# Altium footprint library 6-Connectors-5.PcbLib: 46 footprints (part 3 of 5)
Each footprint in its own frame and in the unit in brackets; x right, y up, seen from the top. Pads: shape width x height; smd on the part's side, far side on the other; paste and mask are expansions set on the pad; w line width, h text height; cw(c..) or ccw(c..) is an arc to the next point about the centre after c.
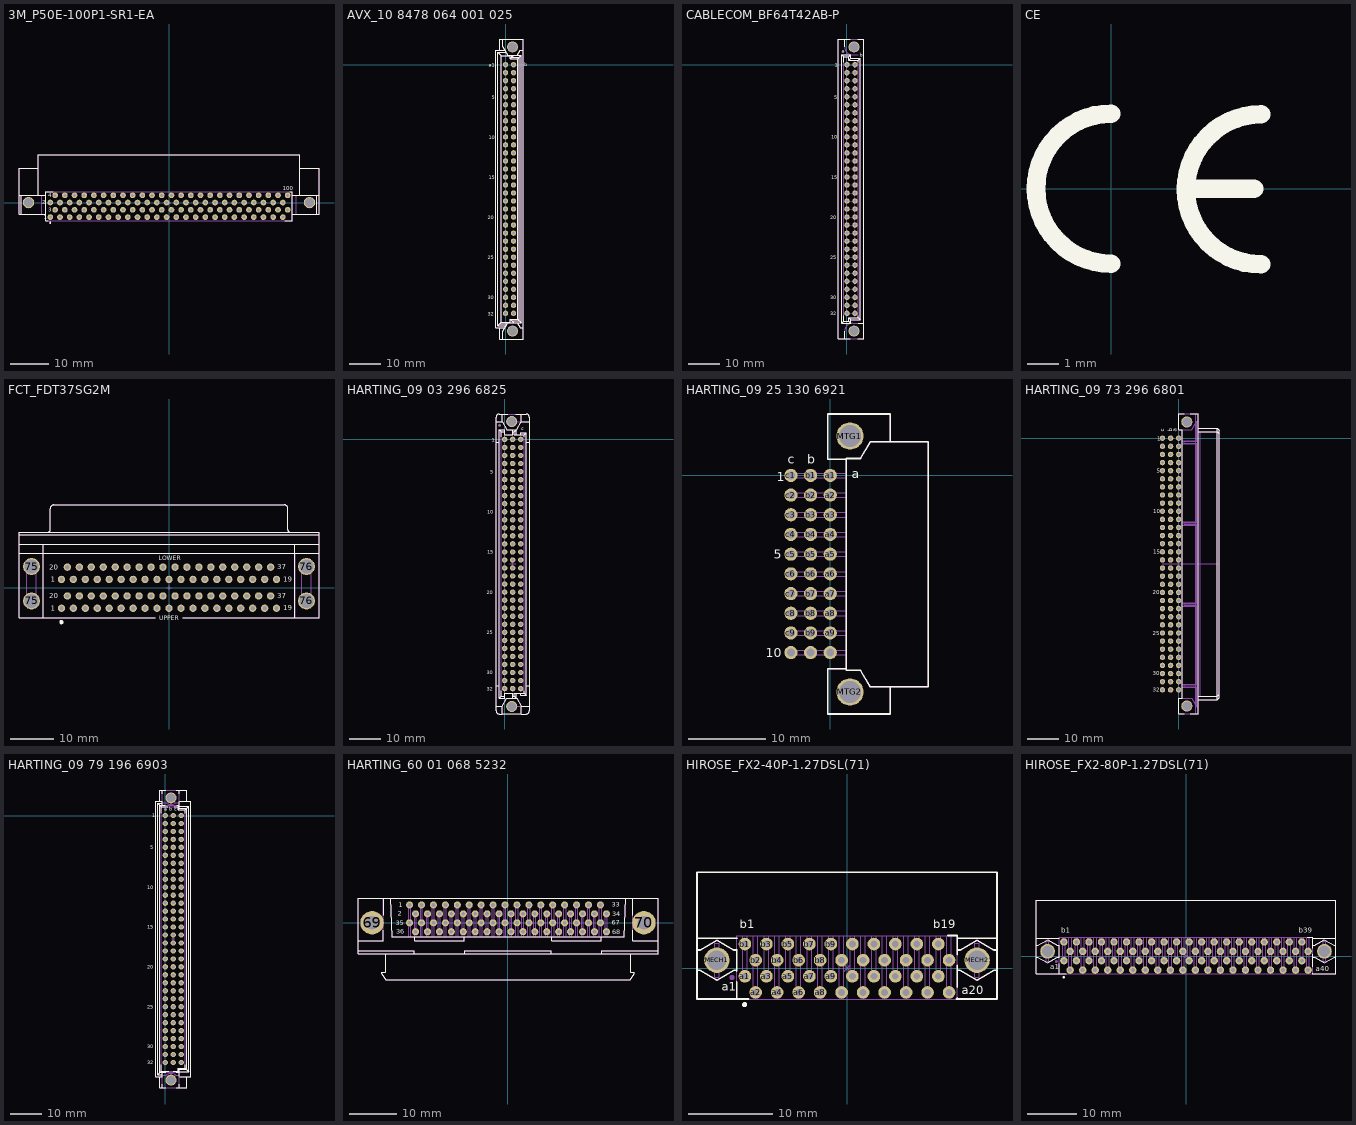
[diagram p2: the footprints below, top view; thin cyan lines are the x and y axes]

## 3M_P50E-100P1-SR1-EA [mm] "100 Contacts - .050\" Right Angle, Pak 50 Boardmount Plug, P50E Series"
height 7
pads (102):
  round 1.5 hole 0.8: 1(-31.115,-3.81) 2(-31.115,0) 3(-29.845,-1.905) 4(-29.845,1.905) 5(-28.575,-3.81) 6(-28.575,0) 7(-27.305,-1.905) 8(-27.305,1.905) 9(-26.035,-3.81) 10(-26.035,0) 11(-24.765,-1.905) 12(-24.765,1.905) 13(-23.495,-3.81) 14(-23.495,0) 15(-22.225,-1.905) 16(-22.225,1.905) 17(-20.955,-3.81) 18(-20.955,0) 19(-19.685,-1.905) 20(-19.685,1.905) 21(-18.415,-3.81) 22(-18.415,0) 23(-17.145,-1.905) 24(-17.145,1.905) 25(-15.875,-3.81) 26(-15.875,0) 27(-14.605,-1.905) 28(-14.605,1.905) 29(-13.335,-3.81) 30(-13.335,0) 31(-12.065,-1.905) 32(-12.065,1.905) 33(-10.795,-3.81) 34(-10.795,0) 35(-9.525,-1.905) 36(-9.525,1.905) 37(-8.255,-3.81) 38(-8.255,0) 39(-6.985,-1.905) 40(-6.985,1.905) 41(-5.715,-3.81) 42(-5.715,0) 43(-4.445,-1.905) 44(-4.445,1.905) 45(-3.175,-3.81) 46(-3.175,0) 47(-1.905,-1.905) 48(-1.905,1.905) 49(-0.635,-3.81) 50(-0.635,0) 51(0.635,-1.905) 52(0.635,1.905) 53(1.905,-3.81) 54(1.905,0) 55(3.175,-1.905) 56(3.175,1.905) 57(4.445,-3.81) 58(4.445,0) 59(5.715,-1.905) 60(5.715,1.905) 61(6.985,-3.81) 62(6.985,0) 63(8.255,-1.905) 64(8.255,1.905) 65(9.525,-3.81) 66(9.525,0) 67(10.795,-1.905) 68(10.795,1.905) 69(12.065,-3.81) 70(12.065,0) 71(13.335,-1.905) 72(13.335,1.905) 73(14.605,-3.81) 74(14.605,0) 75(15.875,-1.905) 76(15.875,1.905) 77(17.145,-3.81) 78(17.145,0) 79(18.415,-1.905) 80(18.415,1.905) 81(19.685,-3.81) 82(19.685,0) 83(20.955,-1.905) 84(20.955,1.905) 85(22.225,-3.81) 86(22.225,0) 87(23.495,-1.905) 88(23.495,1.905) 89(24.765,-3.81) 90(24.765,0) 91(26.035,-1.905) 92(26.035,1.905) 93(27.305,-3.81) 94(27.305,0) 95(28.575,-1.905) 96(28.575,1.905) 97(29.845,-3.81) 98(29.845,0) 99(31.115,-1.905) 100(31.115,1.905)
  round 3 hole 2.3: 101(-36.83,0) 102(36.83,0)
Top Overlay:
  circle w0.3: c-31.115,-5.334 r0.15
  lines w0.2: -39.319,1.906 -32.258,1.906 ; -38.71,-3.098 -38.71,1.906 ; -34.29,1.906 -34.29,12.6 34.29,12.6 34.29,1.906 ; -34.29,8.942 -39.319,8.942 -39.319,-3.098 -32.258,-3.098 ; -31.596,-4.799 -32.258,-4.799 -32.258,2.897 -30.321,2.897 ; 30.326,-4.799 32.258,-4.799 32.258,2.897 31.591,2.897 ; 32.258,-3.098 39.319,-3.098 39.319,8.942 34.29,8.942 ; 32.258,1.906 39.319,1.906 ; 38.71,-3.098 38.71,1.906
  text "3" at -31.669,-2.389 h1.02
  text "4" at -31.669,1.421 h1.02
  text "100" at 29.799,3.199 h1.02
  text "2" at -33.242,-0.484 h1.02
  text "1" at -32.863,-4.421 h1.02
Mechanical 8:
  drawing of 417 lines, arcs and shapes, not listed
Mechanical 14:
  circle w0.1: c-36.83,0 r1.156
  circle w0.1: c36.83,0 r1.156
  circle w0.3: c-31.115,-5.334 r0.15
  lines w0.1: -39.319,1.906 -32.258,1.906 ; -38.71,-3.098 -38.71,1.906 ; -34.29,1.906 -34.29,12.6 34.29,12.6 34.29,1.906 ; -34.29,8.942 -39.319,8.942 -39.319,-3.098 -32.258,-3.098 ; -33.299,-3.098 -33.299,1.906 ; 32.258,-3.098 39.319,-3.098 39.319,8.942 34.29,8.942 ; 32.258,1.906 39.319,1.906 ; 33.299,-3.098 33.299,1.906 ; 38.71,-3.098 38.71,1.906 ; -32.258,-4.799 -32.258,2.897 32.258,2.897 32.258,-4.799 -32.258,-4.799
  text "3" at -31.669,-2.389 h1.02
  text "4" at -31.669,1.421 h1.02
  text "100" at 29.799,3.199 h1.02
  text "2" at -33.242,-0.484 h1.02
  text "1" at -32.863,-4.421 h1.02
3D body "3M_P50E-100P1-SR1.stp": height 7.01, standoff -3, extent -39.319,-4.799 39.319,12.6

## AVX_10 8478 064 001 025 [mm] "DIN 41612, Type Q, Thru-Hole Press-Fit Terminations; Rows a+b, 64 Position, Performance level 2, Lead 5.3mm, Straight Male Connector"
height 11.48
pads (66):
  round 1.7 hole 1: a1(0,0) a2(0,-2.54) a3(0,-5.08) a4(0,-7.62) a5(0,-10.16) a6(0,-12.7) a7(0,-15.24) a8(0,-17.78) a9(0,-20.32) a10(0,-22.86) a11(0,-25.4) a12(0,-27.94) a13(0,-30.48) a14(0,-33.02) a15(0,-35.56) a16(0,-38.1) a17(0,-40.64) a18(0,-43.18) a19(0,-45.72) a20(0,-48.26) a21(0,-50.8) a22(0,-53.34) a23(0,-55.88) a24(0,-58.42) a25(0,-60.96) a26(0,-63.5) a27(0,-66.04) a28(0,-68.58) a29(0,-71.12) a30(0,-73.66) a31(0,-76.2) a32(0,-78.74) b1(2.54,0) b2(2.54,-2.54) b3(2.54,-5.08) b4(2.54,-7.62) b5(2.54,-10.16) b6(2.54,-12.7) b7(2.54,-15.24) b8(2.54,-17.78) b9(2.54,-20.32) b10(2.54,-22.86) b11(2.54,-25.4) b12(2.54,-27.94) b13(2.54,-30.48) b14(2.54,-33.02) b15(2.54,-35.56) b16(2.54,-38.1) b17(2.54,-40.64) b18(2.54,-43.18) b19(2.54,-45.72) b20(2.54,-48.26) b21(2.54,-50.8) b22(2.54,-53.34) b23(2.54,-55.88) b24(2.54,-58.42) b25(2.54,-60.96) b26(2.54,-63.5) b27(2.54,-66.04) b28(2.54,-68.58) b29(2.54,-71.12) b30(2.54,-73.66) b31(2.54,-76.2) b32(2.54,-78.74)
  round 3.5 / inner round 3.5 / far side round 5.1 hole 2.8: MTG1(2.24,5.63) MTG2(2.24,-84.37)
Top Overlay:
  lines w0.2: -1.83,-83.32 -1.83,-86.87 5.57,-86.87 5.57,8.13 -1.83,8.13 -1.83,4.58 ; -1.83,-81.97 0.576,-81.97 ; -0.81,-86.87 -0.81,-84.37 0.749,-81.67 5.02,-81.67 ; -0.81,8.13 -0.81,5.63 0.749,2.93 5.02,2.93 ; -0.204,-83.32 -3.03,-83.32 -3.03,4.58 -0.204,4.58 ; 0.2,-82.62 -2.48,-82.62 ; 0.2,3.88 -2.48,3.88 ; 1.97,-81.02 4.37,-81.02 4.37,2.28 1.97,2.28 1.97,2.93 ; 2.62,-81.67 1.52,-80.57 ; 2.62,2.93 1.52,1.83 ; 3.731,-81.67 4.684,-83.32 5.57,-83.323 ; 3.731,2.93 4.684,4.58 5.57,4.58 ; -2.48,-82.62 -1.38,-81.52 ; -2.48,-82.62 -2.48,3.88 ; -2.48,3.88 -1.38,2.78 ; -1.38,-81.52 1.52,-81.52 1.52,-80.57 ; -1.38,-81.52 -1.38,2.78 ; -1.38,2.78 1.52,2.78 1.52,1.83 ; 1.52,-80.57 3.92,-80.57 ; 1.52,1.83 3.92,1.83 ; 3.92,-80.57 5.02,-81.67 ; 3.92,-80.57 3.92,1.83 ; 3.92,1.83 5.02,2.93 ; 5.02,-81.67 5.02,2.93
  text "b" at 5.945,-0.574 h1.2
  text "32" at -5.575,-79.44 h1.2
  text "5" at -4.35,-10.91 h1.2
  text "10" at -5.275,-23.56 h1.2
  text "30" at -5.575,-74.36 h1.2
  text "25" at -5.575,-61.66 h1.2
  text "20" at -5.575,-48.96 h1.2
  text "15" at -5.275,-36.26 h1.2
  text "a1" at -5.325,-0.625 h1.2
Mechanical 8:
  drawing of 268 lines, arcs and shapes, not listed
Mechanical 14:
  circle w0.1: c2.24,-84.37 r1.27
  circle w0.1: c2.24,5.63 r1.27
  lines w0.1: -1.83,-83.32 -1.83,-86.87 5.57,-86.87 5.57,8.13 -1.83,8.13 -1.83,4.58 ; -1.83,-81.97 0.576,-81.97 ; -0.81,-86.87 -0.81,-84.37 0.749,-81.67 5.02,-81.67 ; -0.81,8.13 -0.81,5.63 0.749,2.93 5.02,2.93 ; -0.204,-83.32 -3.03,-83.32 -3.03,4.58 -0.204,4.58 ; 0.2,-82.62 -2.48,-82.62 ; 0.2,3.88 -2.48,3.88 ; 1.97,-81.02 4.37,-81.02 4.37,2.28 1.97,2.28 1.97,2.93 ; 2.62,-81.67 1.52,-80.57 ; 2.62,2.93 1.52,1.83 ; 3.731,-81.67 4.684,-83.32 5.57,-83.323 ; 3.731,2.93 4.684,4.58 5.57,4.58 ; -2.48,-82.62 -1.38,-81.52 ; -2.48,-82.62 -2.48,3.88 ; -2.48,3.88 -1.38,2.78 ; -1.38,-81.52 1.52,-81.52 1.52,-80.57 ; -1.38,-81.52 -1.38,2.78 ; -1.38,2.78 1.52,2.78 1.52,1.83 ; 1.52,-80.57 3.92,-80.57 ; 1.52,1.83 3.92,1.83 ; 3.92,-80.57 5.02,-81.67 ; 3.92,-80.57 3.92,1.83 ; 3.92,1.83 5.02,2.93 ; 5.02,-81.67 5.02,2.93
  text "a1" at -5.325,-0.625 h1.2
  text "b" at 5.945,-0.574 h1.2
  text "32" at -5.575,-79.44 h1.2
  text "5" at -4.35,-10.91 h1.2
  text "10" at -5.275,-23.56 h1.2
  text "15" at -5.275,-36.26 h1.2
  text "20" at -5.575,-48.96 h1.2
  text "25" at -5.575,-61.66 h1.2
  text "30" at -5.575,-74.36 h1.2
Drill Drawing:
  lines w0.1: 4.27,-57.71 4.27,-80.17 -1.71,-80.17 -1.71,1.43 4.37,1.43 4.37,-19.61
  text "PRESS-FIT TECHNOLOGY diam. 1mm +0.09 -0.06" at 5.34,-56.3 h1
3D body "AVX_10 8478 064 001 025.stp": height 11.6, standoff -5.3, extent -3.03,-86.87 5.57,8.13

## CABLECOM_BF64T42AB-P [mm] "DIN 41612, Type B, Thru-Hole; Rows a+b, 64 Position, Straight Female Connector"
height 11.6
pads (66):
  round 1.7 hole 1: a1(0,0) a2(0,-2.54) a3(0,-5.08) a4(0,-7.62) a5(0,-10.16) a6(0,-12.7) a7(0,-15.24) a8(0,-17.78) a9(0,-20.32) a10(0,-22.86) a11(0,-25.4) a12(0,-27.94) a13(0,-30.48) a14(0,-33.02) a15(0,-35.56) a16(0,-38.1) a17(0,-40.64) a18(0,-43.18) a19(0,-45.72) a20(0,-48.26) a21(0,-50.8) a22(0,-53.34) a23(0,-55.88) a24(0,-58.42) a25(0,-60.96) a26(0,-63.5) a27(0,-66.04) a28(0,-68.58) a29(0,-71.12) a30(0,-73.66) a31(0,-76.2) a32(0,-78.74) b1(2.54,0) b2(2.54,-2.54) b3(2.54,-5.08) b4(2.54,-7.62) b5(2.54,-10.16) b6(2.54,-12.7) b7(2.54,-15.24) b8(2.54,-17.78) b9(2.54,-20.32) b10(2.54,-22.86) b11(2.54,-25.4) b12(2.54,-27.94) b13(2.54,-30.48) b14(2.54,-33.02) b15(2.54,-35.56) b16(2.54,-38.1) b17(2.54,-40.64) b18(2.54,-43.18) b19(2.54,-45.72) b20(2.54,-48.26) b21(2.54,-50.8) b22(2.54,-53.34) b23(2.54,-55.88) b24(2.54,-58.42) b25(2.54,-60.96) b26(2.54,-63.5) b27(2.54,-66.04) b28(2.54,-68.58) b29(2.54,-71.12) b30(2.54,-73.66) b31(2.54,-76.2) b32(2.54,-78.74)
  round 3.5 / inner round 3.5 / far side round 5.1 hole 2.8: MTG1(2.24,5.63) MTG2(2.24,-84.37)
Top Overlay:
  lines w0.2: -1.08,-79.525 -1.08,-81.22 ; -1.08,0.785 -1.08,2.48 ; -0.71,-86.82 -0.71,-84.37 ; -0.71,5.63 -0.71,8.08 ; 1.105,-86.82 -2.73,-86.82 -2.73,8.08 1.105,8.08 ; 3.375,-86.82 5.27,-86.82 5.27,8.08 3.375,8.08 ; 3.532,-81.87 5.27,-81.87 ; 3.62,-79.525 3.62,-80.17 ; 3.62,0.785 3.62,1.43 ; -1.73,-81.87 -1.08,-81.22 ; -1.73,-81.87 -1.73,3.13 ; -1.73,-81.87 1.17,-81.87 ; -1.73,3.13 1.17,3.13 ; -1.73,3.13 -1.08,2.48 ; -1.08,-81.22 0.52,-81.22 ; -1.08,2.48 0.52,2.48 ; 0.52,-81.22 0.52,-80.17 ; 0.52,-81.22 1.17,-81.87 ; 0.52,-80.17 1.17,-80.82 ; 0.52,-80.17 3.62,-80.17 ; 0.52,1.43 1.17,2.08 ; 0.52,1.43 0.52,2.48 ; 0.52,1.43 3.62,1.43 ; 0.52,2.48 1.17,3.13 ; 1.17,-81.87 1.17,-80.82 ; 1.17,-80.82 4.27,-80.82 ; 1.17,2.08 4.27,2.08 ; 1.17,2.08 1.17,3.13 ; 3.62,-80.17 4.27,-80.82 ; 3.62,1.43 4.27,2.08 ; 4.27,-80.82 4.27,2.08
  text "b" at 4.064,2.556 h1.2
  text "a" at -1.651,3.81 h1.2
  text "32" at -5.25,-79.415 h1.2
  text "5" at -4.025,-10.885 h1.2
  text "10" at -4.95,-23.535 h1.2
  text "30" at -5.25,-74.335 h1.2
  text "25" at -5.25,-61.635 h1.2
  text "20" at -5.25,-48.935 h1.2
  text "15" at -4.95,-36.235 h1.2
  text "1" at -3.825,-0.725 h1.2
Mechanical 8:
  drawing of 264 lines, arcs and shapes, not listed
Mechanical 14:
  circle w0.1: c2.24,-84.37 r1.4
  circle w0.1: c2.24,5.63 r1.4
  lines w0.1: -0.71,-86.82 -0.71,-84.37 cw(c1.79,-84.37) 1.794,-81.87 ; -0.71,8.08 -0.71,5.63 ccw(c1.79,5.63) 1.794,3.13 ; 1.207,-81.87 -1.73,-81.87 ; 1.79,-81.87 5.27,-81.87 ; 1.79,3.13 3.625,3.13 ; -1.73,-81.87 -1.08,-81.22 ; -1.73,-81.87 -1.73,3.13 ; -1.73,3.13 1.17,3.13 ; -1.73,3.13 -1.08,2.48 ; -1.08,-81.22 -1.08,2.48 ; -1.08,-81.22 0.52,-81.22 ; -1.08,2.48 0.52,2.48 ; 0.52,-81.22 1.17,-81.87 1.17,-80.82 ; 0.52,-81.22 0.52,-80.17 ; 0.52,-80.17 1.17,-80.82 ; 0.52,-80.17 3.62,-80.17 ; 0.52,1.43 1.17,2.08 ; 0.52,1.43 0.52,2.48 ; 0.52,1.43 3.62,1.43 ; 0.52,2.48 1.17,3.13 ; 1.17,-80.82 4.27,-80.82 ; 1.17,2.08 4.27,2.08 ; 1.17,2.08 1.17,3.13 ; 3.62,-80.17 4.27,-80.82 ; 3.62,-80.17 3.62,1.43 ; 3.62,1.43 4.27,2.08 ; 4.27,-80.82 4.27,2.08 ; -2.73,-86.82 -2.73,8.08 5.27,8.08 5.27,-86.82 -2.73,-86.82
  text "1" at -3.825,-0.725 h1.2
  text "b" at 4.064,2.556 h1.2
  text "a" at -1.651,3.81 h1.2
  text "32" at -5.25,-79.415 h1.2
  text "5" at -4.025,-10.885 h1.2
  text "10" at -4.95,-23.535 h1.2
  text "15" at -4.95,-36.235 h1.2
  text "20" at -5.25,-48.935 h1.2
  text "25" at -5.25,-61.635 h1.2
  text "30" at -5.25,-74.335 h1.2
Drill Drawing:
  lines w0.1: -1.8,-58.42 -1.8,-81.28 4.4,-81.28 4.4,2.54 -1.8,2.54 -1.8,-20.32
  text "PRESS-FIT TECHNOLOGY diam. 1mm +/-0.05" at -1.925,-55.05 h1
3D body "CABLECOM_BF64T42AB-P.stp": height 11.6, standoff -4.5, extent -2.73,-86.82 5.27,8.08

## CE [mm]
Top Overlay:
  lines w0.6: 0,-2.413 cw(c0,0) 0,2.413 ; 2.53,0 4.6,0 ; 4.826,-2.438 cw(c4.826,-0.025) 4.826,2.388
3D body "ce.stp": height 0.02, standoff 0, extent -2.725,-2.725 4.82,2.725

## FCT_FDT37SG2M [mm] "Dual Stacked  Right Angled D-SUB 37 Pins Female Connector, With Threaded Insert UNC 4-40, And PCB Mount Retention"
height 31.5
pads (78):
  round 3.9 hole 3.2: 75(-31.75,-3.06) 75(-31.75,4.89) 76(31.75,-3.06) 76(31.75,4.89)
  round 1.7 hole 1: L1(-24.84,1.91) L2(-22.1,1.91) L3(-19.33,1.91) L4(-16.56,1.91) L5(-13.82,1.91) L6(-11.05,1.91) L7(-8.28,1.91) L8(-5.54,1.91) L9(-2.773,1.91) L10(0,1.91) L11(2.77,1.91) L12(5.54,1.91) L13(8.28,1.91) L14(11.05,1.91) L15(13.82,1.91) L16(16.56,1.91) L17(19.33,1.91) L18(22.1,1.91) L19(24.84,1.91) L20(-23.47,4.75) L21(-20.7,4.75) L22(-17.96,4.75) L23(-15.19,4.75) L24(-12.42,4.75) L25(-9.68,4.75) L26(-6.91,4.75) L27(-4.14,4.75) L28(-1.4,4.75) L29(1.4,4.75) L30(4.14,4.75) L31(6.91,4.75) L32(9.68,4.75) L33(12.42,4.75) L34(15.19,4.75) L35(17.96,4.75) L36(20.7,4.75) L37(23.47,4.75) U1(-24.84,-4.75) U2(-22.1,-4.75) U3(-19.33,-4.75) U4(-16.56,-4.75) U5(-13.82,-4.75) U6(-11.05,-4.75) U7(-8.28,-4.75) U8(-5.54,-4.75) U9(-2.773,-4.75) U10(0,-4.75) U11(2.77,-4.75) U12(5.54,-4.75) U13(8.28,-4.75) U14(11.05,-4.75) U15(13.82,-4.75) U16(16.56,-4.75) U17(19.33,-4.75) U18(22.1,-4.75) U19(24.84,-4.75) U20(-23.47,-1.91) U21(-20.7,-1.91) U22(-17.96,-1.91) U23(-15.19,-1.91) U24(-12.42,-1.91) U25(-9.68,-1.91) U26(-6.91,-1.91) U27(-4.14,-1.91) U28(-1.4,-1.91) U29(1.4,-1.91) U30(4.14,-1.91) U31(6.91,-1.91) U32(9.68,-1.91) U33(12.42,-1.91) U34(15.19,-1.91) U35(17.96,-1.91) U36(20.7,-1.91) U37(23.47,-1.91)
Top Overlay:
  circle w0.5: c-24.845,-7.955 r0.25
  lines w0.2: -34.65,9.99 34.65,9.99 ; -34.65,12.24 34.65,12.24 ; -34.55,7.99 34.55,7.99 ; -29.05,-6.96 -29.05,9.99 ; -27.949,12.84 ccw(c-27.949,13.34) -27.449,13.34 -27.449,18.265 cw(c-26.574,18.265) -26.574,19.14 26.572,19.14 cw(c26.572,18.265) 27.447,18.265 27.447,13.34 ccw(c27.947,13.34) 27.947,12.84 ; -3.14,-6.96 -34.65,-6.96 -34.65,12.84 34.65,12.84 34.65,-6.96 3.14,-6.96 ; 29.05,-6.96 29.05,9.99
  text "LOWER" at -2.425,6.335 h1
  text "UPPER" at -2.21,-7.485 h1
  text "19" at 26.386,1.398 h1.2
  text "19" at 26.386,-5.262 h1.2
  text "20" at -27.626,-2.472 h1.2
  text "20" at -27.626,4.188 h1.2
  text "37" at 25.016,-2.422 h1.2
  text "37" at 25.016,4.238 h1.2
  text "1" at -27.349,1.373 h1.2
  text "1" at -27.349,-5.287 h1.2
Mechanical 8:
  drawing of 316 lines, arcs and shapes, not listed
Mechanical 14:
  lines w0.1: -34.65,9.99 34.65,9.99 ; -34.65,12.24 34.65,12.24 ; -34.55,7.99 34.55,7.99 ; -29.05,-6.96 -29.05,7.99 -29.05,9.99 ; -27.949,12.84 ccw(c-27.949,13.34) -27.449,13.34 -27.449,18.265 cw(c-26.574,18.265) -26.574,19.14 26.572,19.14 cw(c26.572,18.265) 27.447,18.265 27.447,13.34 ccw(c27.947,13.34) 27.947,12.84 ; 3.14,-6.96 34.65,-6.96 34.65,12.84 -34.65,12.84 -34.65,-6.96 ; 29.05,-6.96 29.05,7.99 29.05,9.99 ; 30.684,5.09 30.684,-3.26 32.816,-3.26 32.816,5.09 ; 30.72,5.09 32.828,5.09 ; -34.65,-6.96 -3.14,-6.96 -34.65,-6.96 ; -32.816,-3.26 -32.816,5.09 -30.684,5.09 -30.684,-3.26 -32.816,-3.26
  text "LOWER" at -2.425,6.335 h1
  text "UPPER" at -2.21,-7.485 h1
  text "19" at 26.386,1.398 h1.2
  text "19" at 26.386,-5.262 h1.2
  text "20" at -27.626,-2.472 h1.2
  text "20" at -27.626,4.188 h1.2
  text "37" at 25.016,-2.422 h1.2
  text "37" at 25.016,4.238 h1.2
  text "1" at -27.349,1.373 h1.2
  text "1" at -27.349,-5.287 h1.2
3D body "FCT_FDT37SG2M.stp": height 31.7, standoff -3.5, extent -34.65,-6.96 34.65,19.14

## HARTING_09 03 296 6825 [mm] "DIN 41612, Type C,  Thru-Hole; Rows a+b+c, 96 Position, Performance level 2, Lead 4.5mm, Pitch 2.54mm, Straight Female Connector"
height 11.6
pads (98):
  round 1.7 hole 1: a1(0,0) a2(0,-2.54) a3(0,-5.08) a4(0,-7.62) a5(0,-10.16) a6(0,-12.7) a7(0,-15.24) a8(0,-17.78) a9(0,-20.32) a10(0,-22.86) a11(0,-25.4) a12(0,-27.94) a13(0,-30.48) a14(0,-33.02) a15(0,-35.56) a16(0,-38.1) a17(0,-40.64) a18(0,-43.18) a19(0,-45.72) a20(0,-48.26) a21(0,-50.8) a22(0,-53.34) a23(0,-55.88) a24(0,-58.42) a25(0,-60.96) a26(0,-63.5) a27(0,-66.04) a28(0,-68.58) a29(0,-71.12) a30(0,-73.66) a31(0,-76.2) a32(0,-78.74) b1(2.54,0) b2(2.54,-2.54) b3(2.54,-5.08) b4(2.54,-7.62) b5(2.54,-10.16) b6(2.54,-12.7) b7(2.54,-15.24) b8(2.54,-17.78) b9(2.54,-20.32) b10(2.54,-22.86) b11(2.54,-25.4) b12(2.54,-27.94) b13(2.54,-30.48) b14(2.54,-33.02) b15(2.54,-35.56) b16(2.54,-38.1) b17(2.54,-40.64) b18(2.54,-43.18) b19(2.54,-45.72) b20(2.54,-48.26) b21(2.54,-50.8) b22(2.54,-53.34) b23(2.54,-55.88) b24(2.54,-58.42) b25(2.54,-60.96) b26(2.54,-63.5) b27(2.54,-66.04) b28(2.54,-68.58) b29(2.54,-71.12) b30(2.54,-73.66) b31(2.54,-76.2) b32(2.54,-78.74) c1(5.08,0) c2(5.08,-2.54) c3(5.08,-5.08) c4(5.08,-7.62) c5(5.08,-10.16) c6(5.08,-12.7) c7(5.08,-15.24) c8(5.08,-17.78) c9(5.08,-20.32) c10(5.08,-22.86) c11(5.08,-25.4) c12(5.08,-27.94) c13(5.08,-30.48) c14(5.08,-33.02) c15(5.08,-35.56) c16(5.08,-38.1) c17(5.08,-40.64) c18(5.08,-43.18) c19(5.08,-45.72) c20(5.08,-48.26) c21(5.08,-50.8) c22(5.08,-53.34) c23(5.08,-55.88) c24(5.08,-58.42) c25(5.08,-60.96) c26(5.08,-63.5) c27(5.08,-66.04) c28(5.08,-68.58) c29(5.08,-71.12) c30(5.08,-73.66) c31(5.08,-76.2) c32(5.08,-78.74)
  round 3.5 / inner round 3.5 / far side round 5.1 hole 2.8: MTG1(2.24,5.63) MTG2(2.24,-84.37)
Top Overlay:
  lines w0.2: -2.71,-84.37 -0.735,-84.37 ; -2.71,-77.87 -1.685,-77.87 ; -1.685,-0.87 -2.71,-0.87 -2.71,5.63 -0.735,5.63 ; -1.035,-79.4 -1.035,-81.195 ; -1.035,0.775 -1.035,2.455 ; 1,8.03 -0.735,8.03 ; 2.54,-81.845 2.54,-81.195 ; 2.54,3.105 2.54,2.455 ; 3.5,8.03 5.215,8.03 ; 3.665,-80.145 3.665,-81.845 3.015,-81.195 ; 3.665,1.405 3.665,3.105 3.015,2.455 ; 6.115,-79.425 6.115,-80.145 ; 6.115,0.825 6.115,1.405 ; 6.765,-77.87 7.79,-77.87 ; 6.765,-0.87 7.79,-0.87 ; 7.79,-84.37 5.215,-84.37 ; 7.79,5.63 5.215,5.63 ; -1.685,-81.845 0,-81.845 0,-81.195 ; -1.685,-81.845 -1.035,-81.195 ; -1.685,-81.845 -1.685,3.105 ; -1.685,3.105 -1.035,2.455 ; -1.685,3.105 0,3.105 0,2.455 ; -1.035,-81.195 0,-81.195 ; -1.035,2.455 0,2.455 ; -0.735,-86.77 -1.71,-86.77 cw(c-1.71,-85.77) -2.71,-85.77 -2.71,7.03 cw(c-1.71,7.03) -1.71,8.03 -0.735,8.03 ; -0.735,-86.77 5.215,-86.77 ; -0.735,-86.77 -0.735,-84.37 ; -0.735,-84.37 0.723,-81.845 3.757,-81.845 5.215,-84.37 ; -0.735,5.63 0.723,3.105 3.757,3.105 5.215,5.63 ; -0.735,5.63 -0.735,8.03 ; 0,-81.195 0,-80.145 2.54,-80.145 2.54,-81.195 ; 0,2.455 0,1.405 2.54,1.405 2.54,2.455 ; 2.54,-81.195 3.015,-81.195 ; 2.54,2.455 3.015,2.455 ; 3.015,-81.195 3.015,-80.145 5.08,-80.145 ; 3.015,2.455 3.015,1.405 5.08,1.405 ; 5.08,-80.145 5.08,-80.795 6.765,-80.795 ; 5.08,-80.145 6.115,-80.145 ; 5.08,1.405 6.115,1.405 ; 5.08,1.405 5.08,2.055 6.765,2.055 ; 5.215,-86.77 6.79,-86.77 ccw(c6.79,-85.77) 7.79,-85.77 7.79,7.03 ccw(c6.79,7.03) 6.79,8.03 5.215,8.03 ; 5.215,-86.77 5.215,-84.37 ; 5.215,5.63 5.215,8.03 ; 6.115,-80.145 6.765,-80.795 ; 6.115,1.405 6.765,2.055 ; 6.765,-80.795 6.765,2.055
  text "a" at -1.951,3.96 h1.2
  text "c" at 5.305,2.935 h1.2
  text "10" at -5.475,-23.46 h1.2
  text "32" at -5.675,-79.365 h1.2
  text "5" at -4.55,-10.835 h1.2
  text "30" at -5.675,-74.285 h1.2
  text "25" at -5.675,-61.585 h1.2
  text "20" at -5.675,-48.885 h1.2
  text "15" at -5.475,-36.135 h1.2
  text "1" at -4.075,-0.675 h1.2
Mechanical 8:
  lines w0.1: 1.54,-39.37 2.54,-39.37 ; 2.24,-84.37 4.78,-84.37 ; 2.24,5.63 4.78,5.63 ; 2.54,-40.37 2.54,-39.37 ; 2.54,-38.37 2.54,-39.37 ; 3.54,-39.37 2.54,-39.37
Mechanical 14:
  circle w0.1: c2.24,-84.37 r1.425
  circle w0.1: c2.24,5.63 r1.425
  lines w0.1: -2.71,-84.37 -0.735,-84.37 ; -2.71,5.63 -0.735,5.63 ; -0.735,-86.77 -0.735,-84.37 ; -0.735,8.03 -0.735,5.63 ; 3.665,-80.145 3.665,-81.845 ; 3.665,1.405 3.665,3.105 3.015,2.455 ; 3.757,3.105 5.215,5.63 ; 5.215,-86.77 5.215,-84.37 ; 5.215,8.03 5.215,5.63 ; 7.79,-84.37 5.215,-84.37 ; 7.79,5.63 5.215,5.63 ; -1.685,-81.845 -1.035,-81.195 ; -1.685,-81.845 0,-81.845 0,-81.195 ; -1.685,-81.845 -1.685,3.105 ; -1.685,3.105 -1.035,2.455 ; -1.685,3.105 0,3.105 0,2.455 ; -1.035,-81.195 -1.035,2.455 ; -1.035,-81.195 0,-81.195 ; -1.035,2.455 0,2.455 ; -0.735,-84.37 0.723,-81.845 2.54,-81.845 ; -0.735,5.63 0.723,3.105 2.54,3.105 2.54,2.455 ; 0,-81.195 0,-80.145 2.54,-80.145 2.54,-81.195 ; 0,2.455 0,1.405 2.54,1.405 2.54,2.455 ; 2.54,-81.845 2.54,-81.195 ; 2.54,-81.845 3.665,-81.845 ; 2.54,-81.195 3.015,-81.195 ; 2.54,2.455 3.015,2.455 ; 3.015,-81.195 3.015,-80.145 5.08,-80.145 ; 3.015,-81.195 3.665,-81.845 ; 3.015,2.455 3.015,1.405 5.08,1.405 ; 3.665,-81.845 3.757,-81.845 5.215,-84.37 ; 5.08,-80.145 6.115,-80.145 ; 5.08,-80.145 5.08,-80.795 6.765,-80.795 ; 5.08,1.405 6.115,1.405 ; 5.08,1.405 5.08,2.055 6.765,2.055 ; 6.115,-80.145 6.115,1.405 ; 6.115,-80.145 6.765,-80.795 ; 6.115,1.405 6.765,2.055 ; 6.765,-80.795 6.765,2.055 ; -2.71,-85.77 ccw(c-1.71,-85.77) -1.71,-86.77 6.79,-86.77 ccw(c6.79,-85.77) 7.79,-85.77 7.79,7.03 ccw(c6.79,7.03) 6.79,8.03 -1.71,8.03 ccw(c-1.71,7.03) -2.71,7.03 -2.71,-85.77
  text "a" at -1.951,3.96 h1.2
  text "c" at 5.305,2.935 h1.2
  text "10" at -5.475,-23.46 h1.2
  text "32" at -5.675,-79.365 h1.2
  text "5" at -4.55,-10.835 h1.2
  text "30" at -5.675,-74.285 h1.2
  text "25" at -5.675,-61.585 h1.2
  text "20" at -5.675,-48.885 h1.2
  text "15" at -5.475,-36.135 h1.2
  text "1" at -4.075,-0.675 h1.2
3D body "HARTING_09 03 296 6825.stp": height 11.6, standoff -4.5, extent -2.71,-86.82 7.79,8.08
